# Altium footprint library lib_datalogger.PcbLib: 866 footprints (part 14 of 55)
Each footprint in its own frame and in the unit in brackets; x right, y up, seen from the top. Pads: shape width x height; smd on the part's side, far side on the other; paste and mask are expansions set on the pad; w line width, h text height; cw(c..) or ccw(c..) is an arc to the next point about the centre after c.
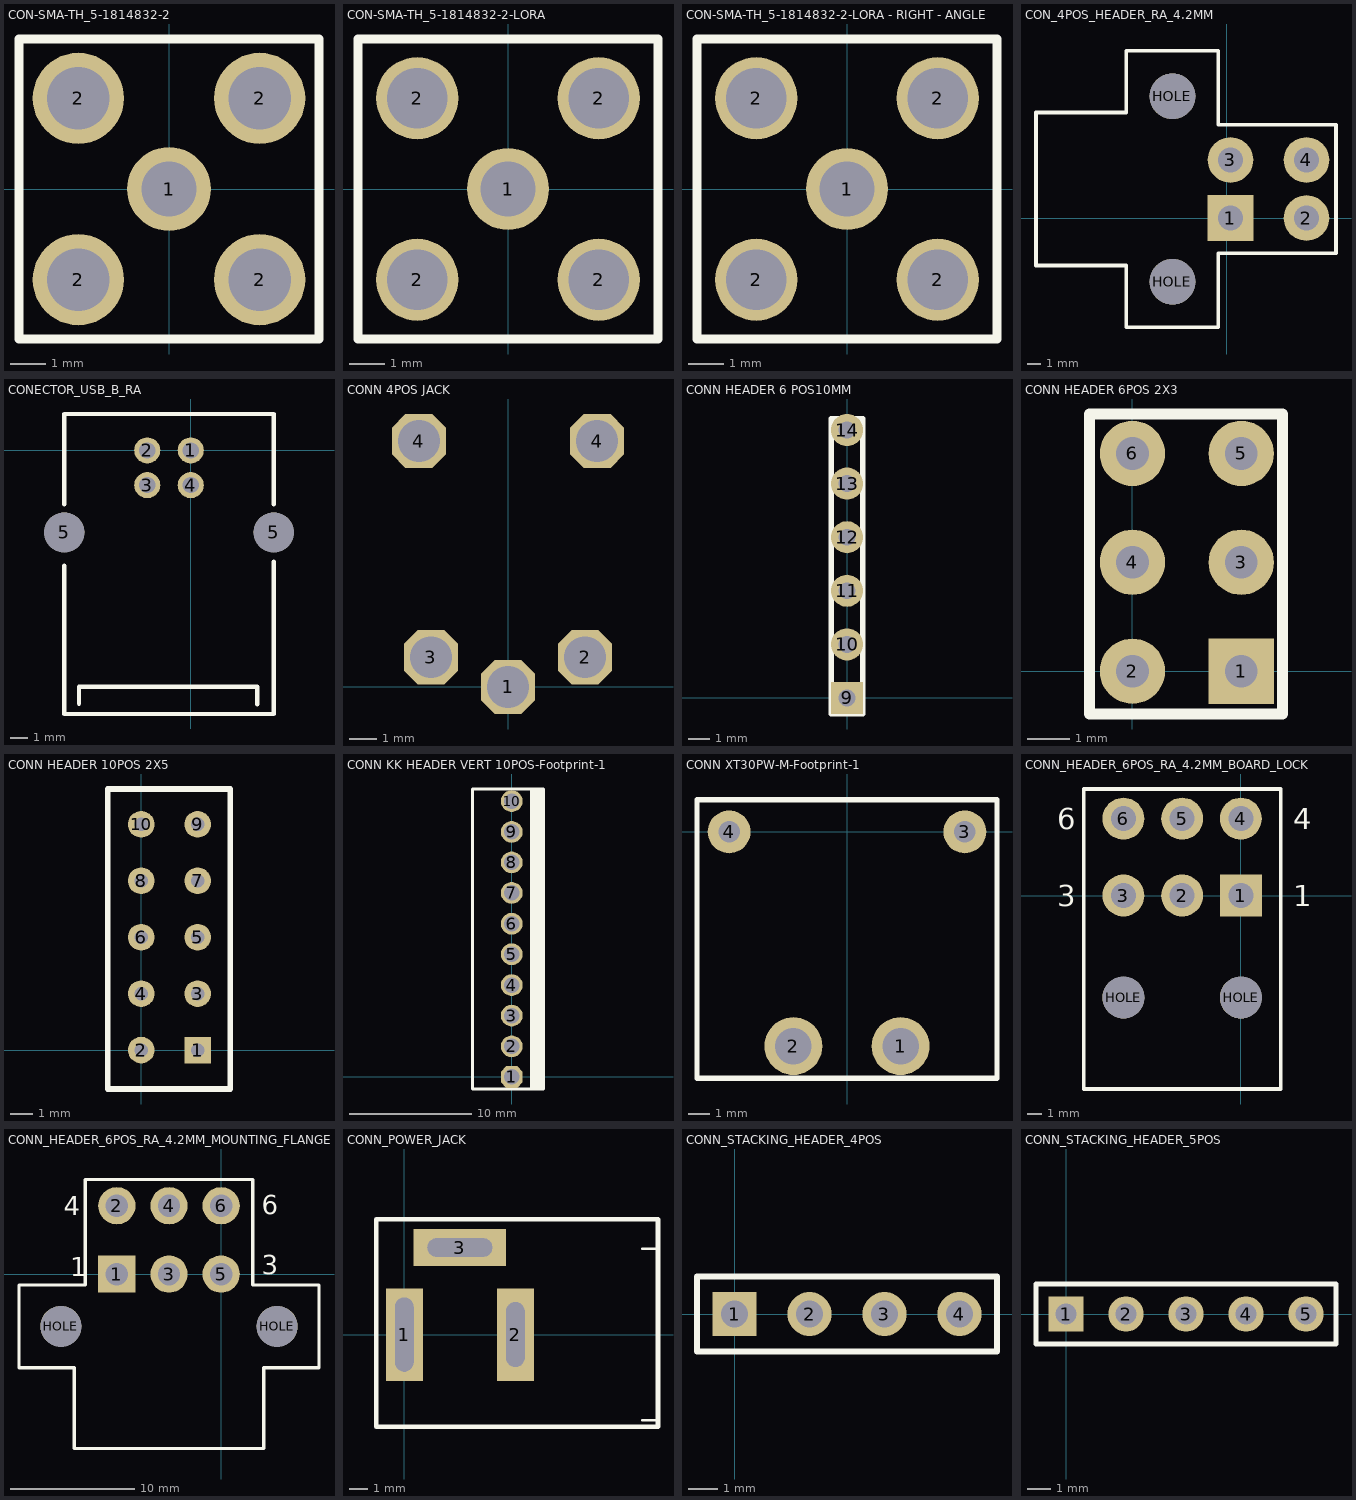
[diagram p13: the footprints below, top view; thin cyan lines are the x and y axes]

## CON-SMA-TH_5-1814832-2 [mm]
pads (5):
  round 2.35 hole 1.55: 1(0,0)
  round 2.55 hole 1.75: 2(-2.54,-2.54) 2(-2.54,2.54) 2(2.54,-2.54) 2(2.54,2.54)
Top Overlay:
  lines w0.254: -4.2,-4.2 4.2,-4.2 4.2,4.2 -4.2,4.2 -4.2,-4.2
3D body "5-1814832-2.step": height 10, standoff -3.5, extent -3.2,-3.2 3.2,3.2

## CON-SMA-TH_5-1814832-2-LORA [mm]
pads (5):
  round 2.3 hole 1.55: 1(0,0)
  round 2.3 hole 1.7: 2(-2.54,-2.54) 2(-2.54,2.54) 2(2.54,-2.54) 2(2.54,2.54)
Top Overlay:
  lines w0.254: -4.2,-4.2 -4.2,4.2 4.2,4.2 4.2,-4.2 -4.2,-4.2
3D body: height 0.6, standoff -2, extent -0.298,-0.299 0.3,0.3
3D body: height 0.6, standoff -2, extent 1.756,-3.248 3.25,-1.751
3D body: height 0.6, standoff -2, extent -3.244,-3.248 -1.75,-1.751
3D body: height 0.6, standoff -2, extent -3.244,1.752 -1.75,3.249
3D body: height 0.6, standoff -2, extent 1.756,1.752 3.25,3.249
3D body: height 2.5, standoff 0.6, extent -3.5,-3.5 3.5,3.5
3D body: height 16.5, standoff 2.5, extent -0.297,-0.299 0.3,0.3
3D body: height 42.3, standoff 16.5, extent -3,-2.997 3,2.997
3D body: height 14.68, standoff -21.4, extent -1.8,0.5 -1.8,0.5
3D body: height 14.68, standoff -21.4, extent 2.4,0.8 2.4,0.8

## CON-SMA-TH_5-1814832-2-LORA - RIGHT - ANGLE [mm]
pads (5):
  round 2.3 hole 1.55: 1(0,0)
  round 2.3 hole 1.7: 2(-2.54,-2.54) 2(-2.54,2.54) 2(2.54,-2.54) 2(2.54,2.54)
Top Overlay:
  lines w0.254: -4.2,-4.2 4.2,-4.2 4.2,4.2 -4.2,4.2 -4.2,-4.2
3D body: height 14.68, standoff -21.4, extent 2.4,0.8 2.4,0.8
3D body: height 14.68, standoff -21.4, extent -1.8,0.5 -1.8,0.5
3D body "RP-SMA.stp": height 9.8, standoff -3.8, extent -3.525,-12.154 3.475,3.547

## CON_4POS_HEADER_RA_4.2MM [mil] "METALTEX MFPN-4"
pads (6):
  rect 130x130 hole 70: 1(10,0)
  round 130 hole 70: 2(226,0) 3(10,165) 4(226,165)
  round 130 hole 130: HOLE(-155,-181) HOLE(-155,346)
Top Overlay:
  lines w10: -543,-135 -543,300 -287,300 -287,475 -25,475 -25,265 310,265 310,-100 -25,-100 -25,-310 -287,-310 -287,-135 -543,-135
3D body "4p-val-u-lok-ra.stp": height 429.13, standoff -141.73, extent -535.91,-303.48 249.91,468.48

## CONECTOR_USB_B_RA [mm] "Connector"
height 11
pads (6):
  round 1.5 hole 0.92: 1(0,0) 2(-2.5,0) 3(-2.5,-2) 4(0,-2)
  round 2.3 hole 2.3: 5(-7.27,-4.71) 5(4.77,-4.71)
Top Overlay:
  lines w0.254: -7.27,-6.638 -7.27,-15.15 4.77,-15.15 4.77,-6.41 ; -7.27,-3.107 -7.27,2.09 4.77,2.09 4.77,-3.107 ; -6.42,-14.55 -6.42,-13.58 3.82,-13.58 3.82,-14.58
3D body "670688000.stp": height 11, standoff -4.22, extent -8.68,-15.08 6.18,1.92

## CONN 4POS JACK [mm]
pads (5):
  oct 2x2 hole 1.55: 1(0,0) 2(2.85,1.1) 3(-2.85,1.1) 4(-3.3,9.1) 4(3.3,9.1)

## CONN HEADER 6 POS10MM [mil]
pads (6):
  rect 60x60 hole 31.5: 9(0,0)
  round 60 hole 31.5: 10(0,100) 11(0,200) 12(0,300) 13(0,400) 14(0,500)
Top Overlay:
  lines w10: -29.53,-29.53 29.53,-29.53 29.53,521.65 -29.53,521.65 -29.53,-29.53
3D body "Header_Fem_1X6.STEP": height 334.65, standoff -125.98, extent -50.39,-59.05 49.61,560.63

## CONN HEADER 6POS 2X3 [mil]
pads (6):
  rect 60x60 hole 30: 1(100,0)
  round 60 hole 30: 2(0,0) 3(100,100) 4(0,100) 5(100,200) 6(0,200)
Top Overlay:
  lines w10: -39.37,-39.37 137.8,-39.37 137.8,236.22 -29.53,236.22 -39.37,236.22 -39.37,-39.37
3D body "Header_Mal2x3 Header.STEP": height 334.65, standoff -118.11, extent -49.21,-51.57 149.21,248.43

## CONN HEADER 10POS 2X5 [mm]
pads (10):
  rect 1.2x1.2 hole 0.6: 1(2.54,0)
  round 1.2 hole 0.6: 2(0,0) 3(2.54,2.54) 4(0,2.54) 5(2.54,5.08) 6(0,5.08) 7(2.54,7.62) 8(0,7.62) 9(2.54,10.16) 10(0,10.16)
Top Overlay:
  lines w0.254: -1.5,-1.75 -1.5,11.75 4,11.75 4,-0.75 4,-1.75 -0.292,-1.75 -1.5,-1.75
3D body "Header_Fem_2X5.STEP": height 8.5, standoff -3, extent -1.25,-1.6 3.75,11.6

## CONN KK HEADER VERT 10POS-Footprint-1 [mil]
pads (10):
  oct 70x70 hole 50: 1(0,0)
  round 70 hole 50: 2(0,98) 3(0,197) 4(0,295) 5(0,394) 6(0,492) 7(0,591) 8(0,689) 9(0,787) 10(0,886)
Top Overlay:
  region: 102,-39 60,-39 60,925 102,925
  lines w10: -126,-39 102,-39 102,925 -126,925 -126,-39
3D body "User Library-Molex 10 pines.STEP": height 464.54, standoff -137.77, extent -116.22,-51.46 120,941.46

## CONN XT30PW-M-Footprint-1 [mm]
pads (4):
  round 2.7 hole 1.7: 1(2.5,-10) 2(-2.5,-10)
  round 2 hole 1: 3(5.5,0) 4(-5.5,0)
Top Overlay:
  lines w0.254: -7,-11.5 7,-11.5 7,1.5 -7,1.5 -7,-11.5
3D body "User Library-xt30-f.STEP": height 5.1, standoff -0.1, extent -4.95,-3.025 5.25,9.375
3D body "XT30PW-M--3DModel-STEP-1.STEP": height 5, standoff -2, extent -6.65,-11 6.65,2.95

## CONN_HEADER_6POS_RA_4.2MM_BOARD_LOCK [mm]
pads (8):
  rect 3x3 hole 1.8: 1(0,0)
  round 3 hole 1.8: 2(-4.2,0) 3(-8.4,0) 4(0,5.5) 5(-4.2,5.5) 6(-8.4,5.5)
  round 3 hole 3: HOLE(-8.4,-7.3) HOLE(0,-7.3)
Top Overlay:
  lines w0.254: -11.252,-13.843 2.852,-13.843 2.852,7.62 -11.252,7.62 -11.252,-13.843
  text "3" at -13.132,-0.762 h1.52
  text "6" at -13.132,4.738 h1.52
  text "4" at 3.759,4.738 h1.52
  text "1" at 3.759,-0.762 h1.52
3D body "c-1-794528-1-d-3d.stp": height 11.7, standoff -3.2, extent -11.1,-13.677 2.7,6.057

## CONN_HEADER_6POS_RA_4.2MM_MOUNTING_FLANGE [mm]
pads (8):
  rect 3x3 hole 1.8: 1(-8.4,0)
  round 3 hole 1.8: 2(-8.4,5.5) 3(-4.2,0) 4(-4.2,5.5) 5(0,0) 6(0,5.5)
  round 3.3 hole 3.3: HOLE(-12.9,-4.2) HOLE(4.5,-4.2)
Top Overlay:
  lines w0.254: -16.274,-7.544 -11.829,-7.544 -11.829,-14.046 3.429,-14.046 3.429,-7.544 7.874,-7.544 7.874,-0.889 2.54,-0.889 2.54,7.62 -10.94,7.62 -10.94,-0.889 -16.274,-0.889 -16.274,-7.544
  text "1" at -12.159,-0.176 h1.52
  text "4" at -12.667,4.738 h1.52
  text "6" at 3.284,4.826 h1.52
  text "3" at 3.284,0 h1.52
3D body "conector-laco-6p.stp": height 11.4, standoff -3.5, extent -16.1,-13.919 7.7,5.981

## CONN_POWER_JACK [mm]
pads (3):
  rect 2x5 hole 1 slot 4 at 90 deg: 1(0,0)
  rect 2x5 hole 1 slot 3.5 at 90 deg: 2(6,0)
  rect 5x2 hole 1 slot 3.5 at 0 deg: 3(3,4.7)
Top Overlay:
  lines w0.127: 12.855,-4.635 13.7,-4.635 ; 12.855,4.635 13.7,4.635 ; 13.7,-4.7 13.7,4.7
  lines w0.254: -1.521,-4.978 13.7,-4.978 13.7,6.224 -1.521,6.224 -1.521,-4.978
3D body "pj-002ah.stp": height 11.1, standoff -3.4, extent -0.658,-4.496 13.742,4.904

## CONN_STACKING_HEADER_4POS [mm]
pads (4):
  rect 1.5x1.5 hole 0.9: 1(0,0)
  round 1.5 hole 0.9: 2(2.54,0) 3(5.08,0) 4(7.62,0)
Top Overlay:
  lines w0.2: -1.27,-1.27 8.89,-1.27 8.89,1.27 -1.27,1.27 -1.27,-1.27
3D body "HEADER-4POS.stp": height 23, standoff -3, extent -1.36,-1.2 8.8,1.2

## CONN_STACKING_HEADER_5POS [mm]
pads (5):
  rect 1.5x1.5 hole 0.9: 1(0,0)
  round 1.5 hole 0.9: 2(2.54,0) 3(5.08,0) 4(7.62,0) 5(10.16,0)
Top Overlay:
  lines w0.2: -1.27,-1.27 -1.27,1.27 11.43,1.27 11.43,-1.27 -1.27,-1.27
3D body "HEADER-5POS.stp": height 23, standoff -3, extent -1.287,-1.204 11.413,1.196